# Altium footprint library ICs And Semiconductors SMD_BGA.PcbLib: 118 footprints (part 3 of 17)
Each footprint in its own frame and in the unit in brackets; x right, y up, seen from the top. Pads: shape width x height; smd on the part's side, far side on the other; paste and mask are expansions set on the pad; w line width, h text height; cw(c..) or ccw(c..) is an arc to the next point about the centre after c.
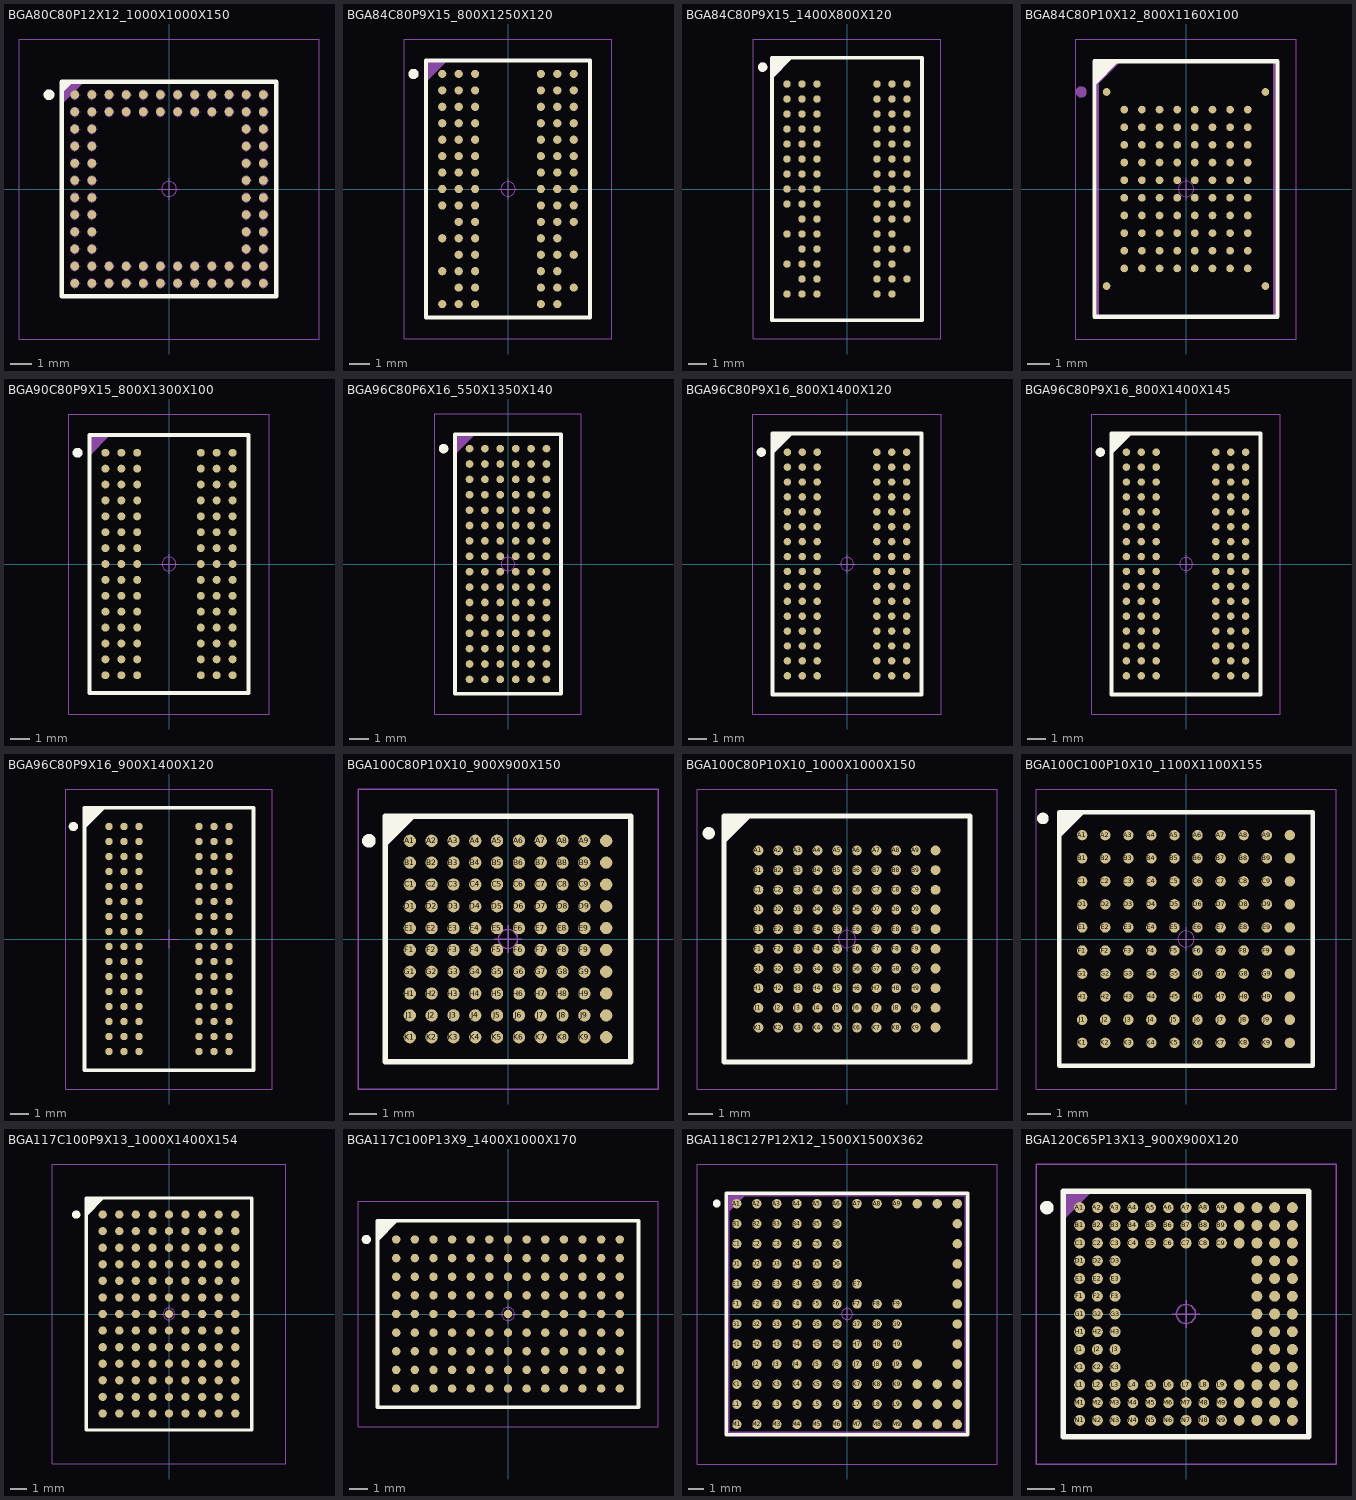
[diagram p2: the footprints below, top view; thin cyan lines are the x and y axes]

## BGA80C80P12X12_1000X1000X150 [mm] "BGA, 0.80mm pitch, square; 80 pin, 12 columns X 12 rows, 10.00mm X 10.00mm X 1.50mm H"
height 1.5
pads (80):
  round 0.4 smd: A1(-4.4,4.4) A2(-3.6,4.4) A3(-2.8,4.4) A4(-2,4.4) A5(-1.2,4.4) A6(-0.4,4.4) A7(0.4,4.4) A8(1.2,4.4) A9(2,4.4) A10(2.8,4.4) A11(3.6,4.4) A12(4.4,4.4) B1(-4.4,3.6) B2(-3.6,3.6) B3(-2.8,3.6) B4(-2,3.6) B5(-1.2,3.6) B6(-0.4,3.6) B7(0.4,3.6) B8(1.2,3.6) B9(2,3.6) B10(2.8,3.6) B11(3.6,3.6) B12(4.4,3.6) C1(-4.4,2.8) C2(-3.6,2.8) C11(3.6,2.8) C12(4.4,2.8) D1(-4.4,2) D2(-3.6,2) D11(3.6,2) D12(4.4,2) E1(-4.4,1.2) E2(-3.6,1.2) E11(3.6,1.2) E12(4.4,1.2) F1(-4.4,0.4) F2(-3.6,0.4) F11(3.6,0.4) F12(4.4,0.4) G1(-4.4,-0.4) G2(-3.6,-0.4) G11(3.6,-0.4) G12(4.4,-0.4) H1(-4.4,-1.2) H2(-3.6,-1.2) H11(3.6,-1.2) H12(4.4,-1.2) J1(-4.4,-2) J2(-3.6,-2) J11(3.6,-2) J12(4.4,-2) K1(-4.4,-2.8) K2(-3.6,-2.8) K11(3.6,-2.8) K12(4.4,-2.8) L1(-4.4,-3.6) L2(-3.6,-3.6) L3(-2.8,-3.6) L4(-2,-3.6) L5(-1.2,-3.6) L6(-0.4,-3.6) L7(0.4,-3.6) L8(1.2,-3.6) L9(2,-3.6) L10(2.8,-3.6) L11(3.6,-3.6) L12(4.4,-3.6) M1(-4.4,-4.4) M2(-3.6,-4.4) M3(-2.8,-4.4) M4(-2,-4.4) M5(-1.2,-4.4) M6(-0.4,-4.4) M7(0.4,-4.4) M8(1.2,-4.4) M9(2,-4.4) M10(2.8,-4.4) M11(3.6,-4.4) M12(4.4,-4.4)
Top Overlay:
  circle w0.25: c-5.6,4.4 r0.125
  lines w0.2: -5,4.6 -4.6,5 ; -5,4.8 -4.8,5 ; -5,-5 -5,5 5,5 5,-5 -5,-5
Mechanical 8:
  drawing of 243 lines, arcs and shapes, not listed
Mechanical 14:
  lines w0.1: -5,4 -4,5 ; -5,4.1 -4.1,5 ; -5,4.2 -4.2,5 ; -5,4.3 -4.3,5 ; -5,4.4 -4.4,5 ; -5,4.5 -4.5,5 ; -5,4.6 -4.6,5 ; -5,4.7 -4.7,5 ; -5,4.8 -4.8,5 ; -5,4.9 -4.9,5 ; -5,-5 -5,5 5,5 5,-5 -5,-5
  text "K" at -5.8,-3.1 h0.6
  text "H" at -5.8,-1.5 h0.6
  text "G" at -5.8,-0.7 h0.6
  text "F" at -5.8,0.1 h0.6
  text "E" at -5.8,0.9 h0.6
  text "D" at -5.8,1.7 h0.6
  text "C" at -5.8,2.5 h0.6
  text "B" at -5.8,3.3 h0.6
  text "A" at -5.8,4.1 h0.6
  text "J" at -5.8,-2.3 h0.6
  text "2" at -3.3,5.3 h0.6
  text "1" at -4.1,5.3 h0.6
  text "3" at -2.5,5.3 h0.6
  text "4" at -1.7,5.3 h0.6
  text "5" at -0.9,5.3 h0.6
  text "6" at -0.1,5.3 h0.6
  text "7" at 0.7,5.3 h0.6
  text "8" at 1.5,5.3 h0.6
  text "9" at 2.3,5.3 h0.6
  text "10" at 3.1,5.3 h0.6
  text "11" at 3.9,5.3 h0.6
  text "12" at 4.7,5.3 h0.6
  text "L" at -5.8,-3.9 h0.6
  text "M" at -5.8,-4.7 h0.6
Mechanical 15:
  circle w0.05: c0,0 r0.35
  lines w0.05: -0.5,0 0.5,0 ; 0,-0.5 0,0.5 ; -7,-7 7,-7 7,7 -7,7 -7,-7
3D body "BGA80C80P12X12_1000X1000X150.stp": height 1.8, standoff 0, extent -5,-5 5,5

## BGA84C80P9X15_800X1250X120 [mm] "BGA, 0.80mm pitch, Rect.; 84 Pin, 9 Columns X 15 Rows, 8.00mm X 12.50mm X 1.20mm H"
height 1.2
pads (84):
  round 0.4 smd: A1(-3.2,5.6) A2(-2.4,5.6) A3(-1.6,5.6) A7(1.6,5.6) A8(2.4,5.6) A9(3.2,5.6) B1(-3.2,4.8) B2(-2.4,4.8) B3(-1.6,4.8) B7(1.6,4.8) B8(2.4,4.8) B9(3.2,4.8) C1(-3.2,4) C2(-2.4,4) C3(-1.6,4) C7(1.6,4) C8(2.4,4) C9(3.2,4) D1(-3.2,3.2) D2(-2.4,3.2) D3(-1.6,3.2) D7(1.6,3.2) D8(2.4,3.2) D9(3.2,3.2) E1(-3.2,2.4) E2(-2.4,2.4) E3(-1.6,2.4) E7(1.6,2.4) E8(2.4,2.4) E9(3.2,2.4) F1(-3.2,1.6) F2(-2.4,1.6) F3(-1.6,1.6) F7(1.6,1.6) F8(2.4,1.6) F9(3.2,1.6) G1(-3.2,0.8) G2(-2.4,0.8) G3(-1.6,0.8) G7(1.6,0.8) G8(2.4,0.8) G9(3.2,0.8) H1(-3.2,0) H2(-2.4,0) H3(-1.6,0) H7(1.6,0) H8(2.4,0) H9(3.2,0) J1(-3.2,-0.8) J2(-2.4,-0.8) J3(-1.6,-0.8) J7(1.6,-0.8) J8(2.4,-0.8) J9(3.2,-0.8) K2(-2.4,-1.6) K3(-1.6,-1.6) K7(1.6,-1.6) K8(2.4,-1.6) K9(3.2,-1.6) L1(-3.2,-2.4) L2(-2.4,-2.4) L3(-1.6,-2.4) L7(1.6,-2.4) L8(2.4,-2.4) M2(-2.4,-3.2) M3(-1.6,-3.2) M7(1.6,-3.2) M8(2.4,-3.2) M9(3.2,-3.2) N1(-3.2,-4) N2(-2.4,-4) N3(-1.6,-4) N7(1.6,-4) N8(2.4,-4) P2(-2.4,-4.8) P3(-1.6,-4.8) P7(1.6,-4.8) P8(2.4,-4.8) P9(3.2,-4.8) R1(-3.2,-5.6) R2(-2.4,-5.6) R3(-1.6,-5.6) R7(1.6,-5.6) R8(2.4,-5.6)
Top Overlay:
  circle w0.25: c-4.6,5.6 r0.125
  lines w0.2: -4,-6.25 4,-6.25 4,6.25 -4,6.25 -4,-6.25
Mechanical 14:
  lines w0.1: -4,5.25 -3,6.25 ; -4,5.35 -3.1,6.25 ; -4,5.45 -3.2,6.25 ; -4,5.55 -3.3,6.25 ; -4,5.65 -3.4,6.25 ; -4,5.75 -3.5,6.25 ; -4,5.85 -3.6,6.25 ; -4,5.95 -3.7,6.25 ; -4,6.05 -3.8,6.25 ; -4,6.15 -3.9,6.25 ; -4,-6.25 4,-6.25 4,6.25 -4,6.25 -4,-6.25
Mechanical 15:
  circle w0.05: c0,0 r0.35
  lines w0.05: -0.5,0 0.5,0 ; 0,-0.5 0,0.5 ; -5.05,-7.3 5.05,-7.3 5.05,7.3 -5.05,7.3 -5.05,-7.3
3D body "BGA84C80P9X15_800X1250X120.stp": height 1.2, standoff 0, extent -4,-6.25 4,6.25

## BGA84C80P9X15_1400X800X120 [mm] "BGA 0.8mm, Pitch, Square 84 Pin, 9 Columns x 15 Rows, Body 14mm X 8mm X 1.2mm H"
height 1.2
pads (84):
  round 0.4 smd: A1(-3.2,5.6) A2(-2.4,5.6) A3(-1.6,5.6) A7(1.6,5.6) A8(2.4,5.6) A9(3.2,5.6) B1(-3.2,4.8) B2(-2.4,4.8) B3(-1.6,4.8) B7(1.6,4.8) B8(2.4,4.8) B9(3.2,4.8) C1(-3.2,4) C2(-2.4,4) C3(-1.6,4) C7(1.6,4) C8(2.4,4) C9(3.2,4) D1(-3.2,3.2) D2(-2.4,3.2) D3(-1.6,3.2) D7(1.6,3.2) D8(2.4,3.2) D9(3.2,3.2) E1(-3.2,2.4) E2(-2.4,2.4) E3(-1.6,2.4) E7(1.6,2.4) E8(2.4,2.4) E9(3.2,2.4) F1(-3.2,1.6) F2(-2.4,1.6) F3(-1.6,1.6) F7(1.6,1.6) F8(2.4,1.6) F9(3.2,1.6) G1(-3.2,0.8) G2(-2.4,0.8) G3(-1.6,0.8) G7(1.6,0.8) G8(2.4,0.8) G9(3.2,0.8) H1(-3.2,0) H2(-2.4,0) H3(-1.6,0) H7(1.6,0) H8(2.4,0) H9(3.2,0) J1(-3.2,-0.8) J2(-2.4,-0.8) J3(-1.6,-0.8) J7(1.6,-0.8) J8(2.4,-0.8) J9(3.2,-0.8) K2(-2.4,-1.6) K3(-1.6,-1.6) K7(1.6,-1.6) K8(2.4,-1.6) K9(3.2,-1.6) L1(-3.2,-2.4) L2(-2.4,-2.4) L3(-1.6,-2.4) L7(1.6,-2.4) L8(2.4,-2.4) M2(-2.4,-3.2) M3(-1.6,-3.2) M7(1.6,-3.2) M8(2.4,-3.2) M9(3.2,-3.2) N1(-3.2,-4) N2(-2.4,-4) N3(-1.6,-4) N7(1.6,-4) N8(2.4,-4) P2(-2.4,-4.8) P3(-1.6,-4.8) P7(1.6,-4.8) P8(2.4,-4.8) P9(3.2,-4.8) R1(-3.2,-5.6) R2(-2.4,-5.6) R3(-1.6,-5.6) R7(1.6,-5.6) R8(2.4,-5.6)
Top Overlay:
  circle w0.25: c-4.5,6.5 r0.125
  region: -3,7 -4,6 -4,7
  lines w0.2: -4,6 -3,7 ; -4,-7 4,-7 4,7 -4,7 -4,-7
Mechanical 14:
  circle w0.25: c-4.5,6.5 r0.125
  region: -3,7 -4,6 -4,7
  lines w0.1: -4,-7 4,-7 4,7 -4,7 -4,-7
  text "L" at -4.5,-2.4 h0.4
  text "K" at -4.5,-1.6 h0.4
  text "M" at -4.5,-3.2 h0.4
  text "H" at -4.5,0 h0.4
  text "G" at -4.5,0.8 h0.4
  text "F" at -4.5,1.6 h0.4
  text "E" at -4.5,2.4 h0.4
  text "D" at -4.5,3.2 h0.4
  text "C" at -4.5,4 h0.4
  text "B" at -4.5,4.8 h0.4
  text "A" at -4.5,5.6 h0.4
  text "N" at -4.5,-4 h0.4
  text "P" at -4.5,-4.8 h0.4
  text "R" at -4.5,-5.6 h0.4
  text "J" at -4.5,-0.8 h0.4
  text "1" at -3.325,7.175 h0.4
  text "2" at -2.525,7.175 h0.4
  text "3" at -1.725,7.175 h0.4
  text "7" at 1.475,7.175 h0.4
  text "8" at 2.275,7.175 h0.4
  text "9" at 3.075,7.175 h0.4
Mechanical 15:
  lines w0.05: -5,-8 5,-8 5,8 -5,8 -5,-8
3D body "BGA84C80P9X15_1400X800X120.stp": height 1.2, standoff 0, extent -4.075,-7.075 4.075,7.075

## BGA84C80P10X12_800X1160X100 [mm] "BGA, 0.80mm Pitch, Rect.; 84 Pin, 10 Columns X 12 Rows,8.00mm X 11.60mm X 1.00mm H"
height 1
pads (84):
  round 0.35 smd: A1(-3.6,4.4) A10(3.6,4.4) B2(-2.8,3.6) B3(-2,3.6) B4(-1.2,3.6) B5(-0.4,3.6) B6(0.4,3.6) B7(1.2,3.6) B8(2,3.6) B9(2.8,3.6) C2(-2.8,2.8) C3(-2,2.8) C4(-1.2,2.8) C5(-0.4,2.8) C6(0.4,2.8) C7(1.2,2.8) C8(2,2.8) C9(2.8,2.8) D2(-2.8,2) D3(-2,2) D4(-1.2,2) D5(-0.4,2) D6(0.4,2) D7(1.2,2) D8(2,2) D9(2.8,2) E2(-2.8,1.2) E3(-2,1.2) E4(-1.2,1.2) E5(-0.4,1.2) E6(0.4,1.2) E7(1.2,1.2) E8(2,1.2) E9(2.8,1.2) F2(-2.8,0.4) F3(-2,0.4) F4(-1.2,0.4) F5(-0.4,0.4) F6(0.4,0.4) F7(1.2,0.4) F8(2,0.4) F9(2.8,0.4) G2(-2.8,-0.4) G3(-2,-0.4) G4(-1.2,-0.4) G5(-0.4,-0.4) G6(0.4,-0.4) G7(1.2,-0.4) G8(2,-0.4) G9(2.8,-0.4) H2(-2.8,-1.2) H3(-2,-1.2) H4(-1.2,-1.2) H5(-0.4,-1.2) H6(0.4,-1.2) H7(1.2,-1.2) H8(2,-1.2) H9(2.8,-1.2) J2(-2.8,-2) J3(-2,-2) J4(-1.2,-2) J5(-0.4,-2) J6(0.4,-2) J7(1.2,-2) J8(2,-2) J9(2.8,-2) K2(-2.8,-2.8) K3(-2,-2.8) K4(-1.2,-2.8) K5(-0.4,-2.8) K6(0.4,-2.8) K7(1.2,-2.8) K8(2,-2.8) K9(2.8,-2.8) L2(-2.8,-3.6) L3(-2,-3.6) L4(-1.2,-3.6) L5(-0.4,-3.6) L6(0.4,-3.6) L7(1.2,-3.6) L8(2,-3.6) L9(2.8,-3.6) M1(-3.6,-4.4) M10(3.6,-4.4)
Top Overlay:
  lines w0.2: -4.15,4.8 -3.15,5.8 ; -4.15,5 -3.35,5.8 ; -4.15,5.2 -3.55,5.8 ; -4.15,5.4 -3.75,5.8 ; -4.15,5.6 -3.95,5.8 ; -4.15,-5.8 4.15,-5.8 4.15,5.8 -4.15,5.8 -4.15,-5.8
Mechanical 14:
  circle w0.25: c-4.75,4.4 r0.125
  lines w0.1: -4,4.8 -3,5.8 ; -4,4.9 -3.1,5.8 ; -4,5 -3.2,5.8 ; -4,5.1 -3.3,5.8 ; -4,5.2 -3.4,5.8 ; -4,5.3 -3.5,5.8 ; -4,5.4 -3.6,5.8 ; -4,5.5 -3.7,5.8 ; -4,5.6 -3.8,5.8 ; -4,5.7 -3.9,5.8 ; -4,-5.8 4,-5.8 4,5.8 -4,5.8 -4,-5.8
Mechanical 15:
  circle w0.05: c0,0 r0.35
  lines w0.05: -0.5,0 0.5,0 ; 0,-0.5 0,0.5 ; -5,-6.8 5,-6.8 5,6.8 -5,6.8 -5,-6.8
3D body "BGA84C80P10X12_800X1160X100.stp": height 1, standoff 0, extent -4,-5.8 4,5.8

## BGA90C80P9X15_800X1300X100 [mm] "BGA, 0.80mm Pitch, Rect.; 90 Pin, 9 Columns X 15 Rows, 8.00mm X 13.00mm X 1.00mm H"
height 1
pads (90):
  round 0.4 smd: A1(-3.2,5.6) A2(-2.4,5.6) A3(-1.6,5.6) A7(1.6,5.6) A8(2.4,5.6) A9(3.2,5.6) B1(-3.2,4.8) B2(-2.4,4.8) B3(-1.6,4.8) B7(1.6,4.8) B8(2.4,4.8) B9(3.2,4.8) C1(-3.2,4) C2(-2.4,4) C3(-1.6,4) C7(1.6,4) C8(2.4,4) C9(3.2,4) D1(-3.2,3.2) D2(-2.4,3.2) D3(-1.6,3.2) D7(1.6,3.2) D8(2.4,3.2) D9(3.2,3.2) E1(-3.2,2.4) E2(-2.4,2.4) E3(-1.6,2.4) E7(1.6,2.4) E8(2.4,2.4) E9(3.2,2.4) F1(-3.2,1.6) F2(-2.4,1.6) F3(-1.6,1.6) F7(1.6,1.6) F8(2.4,1.6) F9(3.2,1.6) G1(-3.2,0.8) G2(-2.4,0.8) G3(-1.6,0.8) G7(1.6,0.8) G8(2.4,0.8) G9(3.2,0.8) H1(-3.2,0) H2(-2.4,0) H3(-1.6,0) H7(1.6,0) H8(2.4,0) H9(3.2,0) J1(-3.2,-0.8) J2(-2.4,-0.8) J3(-1.6,-0.8) J7(1.6,-0.8) J8(2.4,-0.8) J9(3.2,-0.8) K1(-3.2,-1.6) K2(-2.4,-1.6) K3(-1.6,-1.6) K7(1.6,-1.6) K8(2.4,-1.6) K9(3.2,-1.6) L1(-3.2,-2.4) L2(-2.4,-2.4) L3(-1.6,-2.4) L7(1.6,-2.4) L8(2.4,-2.4) L9(3.2,-2.4) M1(-3.2,-3.2) M2(-2.4,-3.2) M3(-1.6,-3.2) M7(1.6,-3.2) M8(2.4,-3.2) M9(3.2,-3.2) N1(-3.2,-4) N2(-2.4,-4) N3(-1.6,-4) N7(1.6,-4) N8(2.4,-4) N9(3.2,-4) P1(-3.2,-4.8) P2(-2.4,-4.8) P3(-1.6,-4.8) P7(1.6,-4.8) P8(2.4,-4.8) P9(3.2,-4.8) R1(-3.2,-5.6) R2(-2.4,-5.6) R3(-1.6,-5.6) R7(1.6,-5.6) R8(2.4,-5.6) R9(3.2,-5.6)
Top Overlay:
  circle w0.25: c-4.6,5.6 r0.125
  lines w0.2: -4,-6.5 -4,6.5 4,6.5 4,-6.5 -4,-6.5
Mechanical 14:
  lines w0.1: -4,5.5 -3,6.5 ; -4,5.6 -3.1,6.5 ; -4,5.7 -3.2,6.5 ; -4,5.8 -3.3,6.5 ; -4,5.9 -3.4,6.5 ; -4,6 -3.5,6.5 ; -4,6.1 -3.6,6.5 ; -4,6.2 -3.7,6.5 ; -4,6.3 -3.8,6.5 ; -4,6.4 -3.9,6.5 ; -4,-6.5 -4,6.5 4,6.5 4,-6.5 -4,-6.5
Mechanical 15:
  circle w0.05: c0,0 r0.35
  lines w0.05: -0.5,0 0.5,0 ; 0,-0.5 0,0.5 ; -5.05,-7.55 -5.05,7.55 5.05,7.55 5.05,-7.55 -5.05,-7.55
3D body "BGA90C80P9X15_800X1300X100.stp": height 1, standoff 0, extent -4,-6.5 4,6.5

## BGA96C80P6X16_550X1350X140 [mm] "BGA, 0.80mm pitch, Rect.; 96 pin, 6 columns X 16 rows, 5.5mm X 13.5mm X 1.40mm H"
height 1.4
pads (96):
  round 0.4 smd: A1(-2,6) A2(-1.2,6) A3(-0.4,6) A4(0.4,6) A5(1.2,6) A6(2,6) B1(-2,5.2) B2(-1.2,5.2) B3(-0.4,5.2) B4(0.4,5.2) B5(1.2,5.2) B6(2,5.2) C1(-2,4.4) C2(-1.2,4.4) C3(-0.4,4.4) C4(0.4,4.4) C5(1.2,4.4) C6(2,4.4) D1(-2,3.6) D2(-1.2,3.6) D3(-0.4,3.6) D4(0.4,3.6) D5(1.2,3.6) D6(2,3.6) E1(-2,2.8) E2(-1.2,2.8) E3(-0.4,2.8) E4(0.4,2.8) E5(1.2,2.8) E6(2,2.8) F1(-2,2) F2(-1.2,2) F3(-0.4,2) F4(0.4,2) F5(1.2,2) F6(2,2) G1(-2,1.2) G2(-1.2,1.2) G3(-0.4,1.2) G4(0.4,1.2) G5(1.2,1.2) G6(2,1.2) H1(-2,0.4) H2(-1.2,0.4) H3(-0.4,0.4) H4(0.4,0.4) H5(1.2,0.4) H6(2,0.4) J1(-2,-0.4) J2(-1.2,-0.4) J3(-0.4,-0.4) J4(0.4,-0.4) J5(1.2,-0.4) J6(2,-0.4) K1(-2,-1.2) K2(-1.2,-1.2) K3(-0.4,-1.2) K4(0.4,-1.2) K5(1.2,-1.2) K6(2,-1.2) L1(-2,-2) L2(-1.2,-2) L3(-0.4,-2) L4(0.4,-2) L5(1.2,-2) L6(2,-2) M1(-2,-2.8) M2(-1.2,-2.8) M3(-0.4,-2.8) M4(0.4,-2.8) M5(1.2,-2.8) M6(2,-2.8) N1(-2,-3.6) N2(-1.2,-3.6) N3(-0.4,-3.6) N4(0.4,-3.6) N5(1.2,-3.6) N6(2,-3.6) P1(-2,-4.4) P2(-1.2,-4.4) P3(-0.4,-4.4) P4(0.4,-4.4) P5(1.2,-4.4) P6(2,-4.4) R1(-2,-5.2) R2(-1.2,-5.2) R3(-0.4,-5.2) R4(0.4,-5.2) R5(1.2,-5.2) R6(2,-5.2) T1(-2,-6) T2(-1.2,-6) T3(-0.4,-6) T4(0.4,-6) T5(1.2,-6) T6(2,-6)
Top Overlay:
  circle w0.25: c-3.35,6 r0.125
  lines w0.2: -2.75,-6.75 -2.75,6.75 2.75,6.75 2.75,-6.75 -2.75,-6.75
Mechanical 8:
  lines w0.001: -2.75,-6.75 -2.75,6.75 2.75,6.75 2.75,-6.75 -2.75,-6.75
Mechanical 14:
  lines w0.1: -2.75,5.75 -1.75,6.75 ; -2.75,5.85 -1.85,6.75 ; -2.75,5.95 -1.95,6.75 ; -2.75,6.05 -2.05,6.75 ; -2.75,6.15 -2.15,6.75 ; -2.75,6.25 -2.25,6.75 ; -2.75,6.35 -2.35,6.75 ; -2.75,6.45 -2.45,6.75 ; -2.75,6.55 -2.55,6.75 ; -2.75,6.65 -2.65,6.75 ; -2.75,-6.75 -2.75,6.75 2.75,6.75 2.75,-6.75 -2.75,-6.75
  text "5" at 1.075,7.275 h0.4
  text "6" at 1.875,7.275 h0.4
  text "4" at 0.275,7.275 h0.4
  text "3" at -0.525,7.275 h0.4
  text "2" at -1.325,7.275 h0.4
  text "1" at -2.125,7.275 h0.4
  text "T" at -3.4,-6.2 h0.4
  text "J" at -3.4,-0.6 h0.4
  text "R" at -3.4,-5.4 h0.4
  text "P" at -3.4,-4.6 h0.4
  text "N" at -3.4,-3.8 h0.4
  text "B" at -3.4,5 h0.4
  text "C" at -3.4,4.2 h0.4
  text "D" at -3.4,3.4 h0.4
  text "E" at -3.4,2.6 h0.4
  text "F" at -3.4,1.8 h0.4
  text "G" at -3.4,1 h0.4
  text "H" at -3.4,0.2 h0.4
  text "M" at -3.4,-3 h0.4
  text "K" at -3.4,-1.4 h0.4
  text "L" at -3.4,-2.2 h0.4
Mechanical 15:
  circle w0.05: c0,0 r0.35
  lines w0.05: -0.5,0 0.5,0 ; 0,-0.5 0,0.5 ; -3.8,-7.8 -3.8,7.8 3.8,7.8 3.8,-7.8 -3.8,-7.8
3D body "BGA96C80P6X16_550X1350X140.stp": height 1.4, standoff 0, extent -2.75,-6.75 2.75,6.75

## BGA96C80P9X16_800X1400X120 [mm] "BGA, 0.80mm Pitch, Rect.; 96 Pin, 9 Columns X 16 Rows, 8.00mm X 14.00mm X 1.20mm H"
height 1.2
pads (96):
  round 0.4 smd: A1(-3.2,6) A2(-2.4,6) A3(-1.6,6) A7(1.6,6) A8(2.4,6) A9(3.2,6) B1(-3.2,5.2) B2(-2.4,5.2) B3(-1.6,5.2) B7(1.6,5.2) B8(2.4,5.2) B9(3.2,5.2) C1(-3.2,4.4) C2(-2.4,4.4) C3(-1.6,4.4) C7(1.6,4.4) C8(2.4,4.4) C9(3.2,4.4) D1(-3.2,3.6) D2(-2.4,3.6) D3(-1.6,3.6) D7(1.6,3.6) D8(2.4,3.6) D9(3.2,3.6) E1(-3.2,2.8) E2(-2.4,2.8) E3(-1.6,2.8) E7(1.6,2.8) E8(2.4,2.8) E9(3.2,2.8) F1(-3.2,2) F2(-2.4,2) F3(-1.6,2) F7(1.6,2) F8(2.4,2) F9(3.2,2) G1(-3.2,1.2) G2(-2.4,1.2) G3(-1.6,1.2) G7(1.6,1.2) G8(2.4,1.2) G9(3.2,1.2) H1(-3.2,0.4) H2(-2.4,0.4) H3(-1.6,0.4) H7(1.6,0.4) H8(2.4,0.4) H9(3.2,0.4) J1(-3.2,-0.4) J2(-2.4,-0.4) J3(-1.6,-0.4) J7(1.6,-0.4) J8(2.4,-0.4) J9(3.2,-0.4) K1(-3.2,-1.2) K2(-2.4,-1.2) K3(-1.6,-1.2) K7(1.6,-1.2) K8(2.4,-1.2) K9(3.2,-1.2) L1(-3.2,-2) L2(-2.4,-2) L3(-1.6,-2) L7(1.6,-2) L8(2.4,-2) L9(3.2,-2) M1(-3.2,-2.8) M2(-2.4,-2.8) M3(-1.6,-2.8) M7(1.6,-2.8) M8(2.4,-2.8) M9(3.2,-2.8) N1(-3.2,-3.6) N2(-2.4,-3.6) N3(-1.6,-3.6) N7(1.6,-3.6) N8(2.4,-3.6) N9(3.2,-3.6) P1(-3.2,-4.4) P2(-2.4,-4.4) P3(-1.6,-4.4) P7(1.6,-4.4) P8(2.4,-4.4) P9(3.2,-4.4) R1(-3.2,-5.2) R2(-2.4,-5.2) R3(-1.6,-5.2) R7(1.6,-5.2) R8(2.4,-5.2) R9(3.2,-5.2) T1(-3.2,-6) T2(-2.4,-6) T3(-1.6,-6) T7(1.6,-6) T8(2.4,-6) T9(3.2,-6)
Top Overlay:
  circle w0.25: c-4.6,6 r0.125
  lines w0.2: -4,6 -3,7 ; -4,6.2 -3.2,7 ; -4,6.4 -3.4,7 ; -4,6.6 -3.6,7 ; -4,6.8 -3.8,7 ; -4,-7 -4,7 4,7 4,-7 -4,-7
Mechanical 14:
  lines w0.1: -4,6 -3,7 ; -4,6.1 -3.1,7 ; -4,6.2 -3.2,7 ; -4,6.3 -3.3,7 ; -4,6.4 -3.4,7 ; -4,6.5 -3.5,7 ; -4,6.6 -3.6,7 ; -4,6.7 -3.7,7 ; -4,6.8 -3.8,7 ; -4,6.9 -3.9,7 ; -4,-7 -4,7 4,7 4,-7 -4,-7
  text "9" at 3.075,7.275 h0.4
  text "8" at 2.275,7.275 h0.4
  text "7" at 1.475,7.275 h0.4
  text "3" at -1.725,7.275 h0.4
  text "2" at -2.525,7.275 h0.4
  text "1" at -3.325,7.275 h0.4
  text "T" at -4.6,-6.2 h0.4
  text "J" at -4.6,-0.6 h0.4
  text "R" at -4.6,-5.4 h0.4
  text "P" at -4.6,-4.6 h0.4
  text "N" at -4.6,-3.8 h0.4
  text "B" at -4.6,5 h0.4
  text "C" at -4.6,4.2 h0.4
  text "D" at -4.6,3.4 h0.4
  text "E" at -4.6,2.6 h0.4
  text "F" at -4.6,1.8 h0.4
  text "G" at -4.6,1 h0.4
  text "H" at -4.6,0.2 h0.4
  text "M" at -4.6,-3 h0.4
  text "K" at -4.6,-1.4 h0.4
  text "L" at -4.6,-2.2 h0.4
Mechanical 15:
  circle w0.05: c0,0 r0.35
  lines w0.05: -0.5,0 0.5,0 ; 0,-0.5 0,0.5 ; -5.05,-8.05 -5.05,8.05 5.05,8.05 5.05,-8.05 -5.05,-8.05
Mechanical 21:
  lines w0.001: -4,-7 -4,7 4,7 4,-7 -4,-7
3D body "BGA96C80P9X16_800X1400X120.stp": height 1.2, standoff 0, extent -4.075,-7.075 4.075,7.075
